# Altium footprint library PcbLib1.PcbLib: 45 footprints (part 2 of 3)
Each footprint in its own frame and in the unit in brackets; x right, y up, seen from the top. Pads: shape width x height; smd on the part's side, far side on the other; paste and mask are expansions set on the pad; w line width, h text height; cw(c..) or ccw(c..) is an arc to the next point about the centre after c.
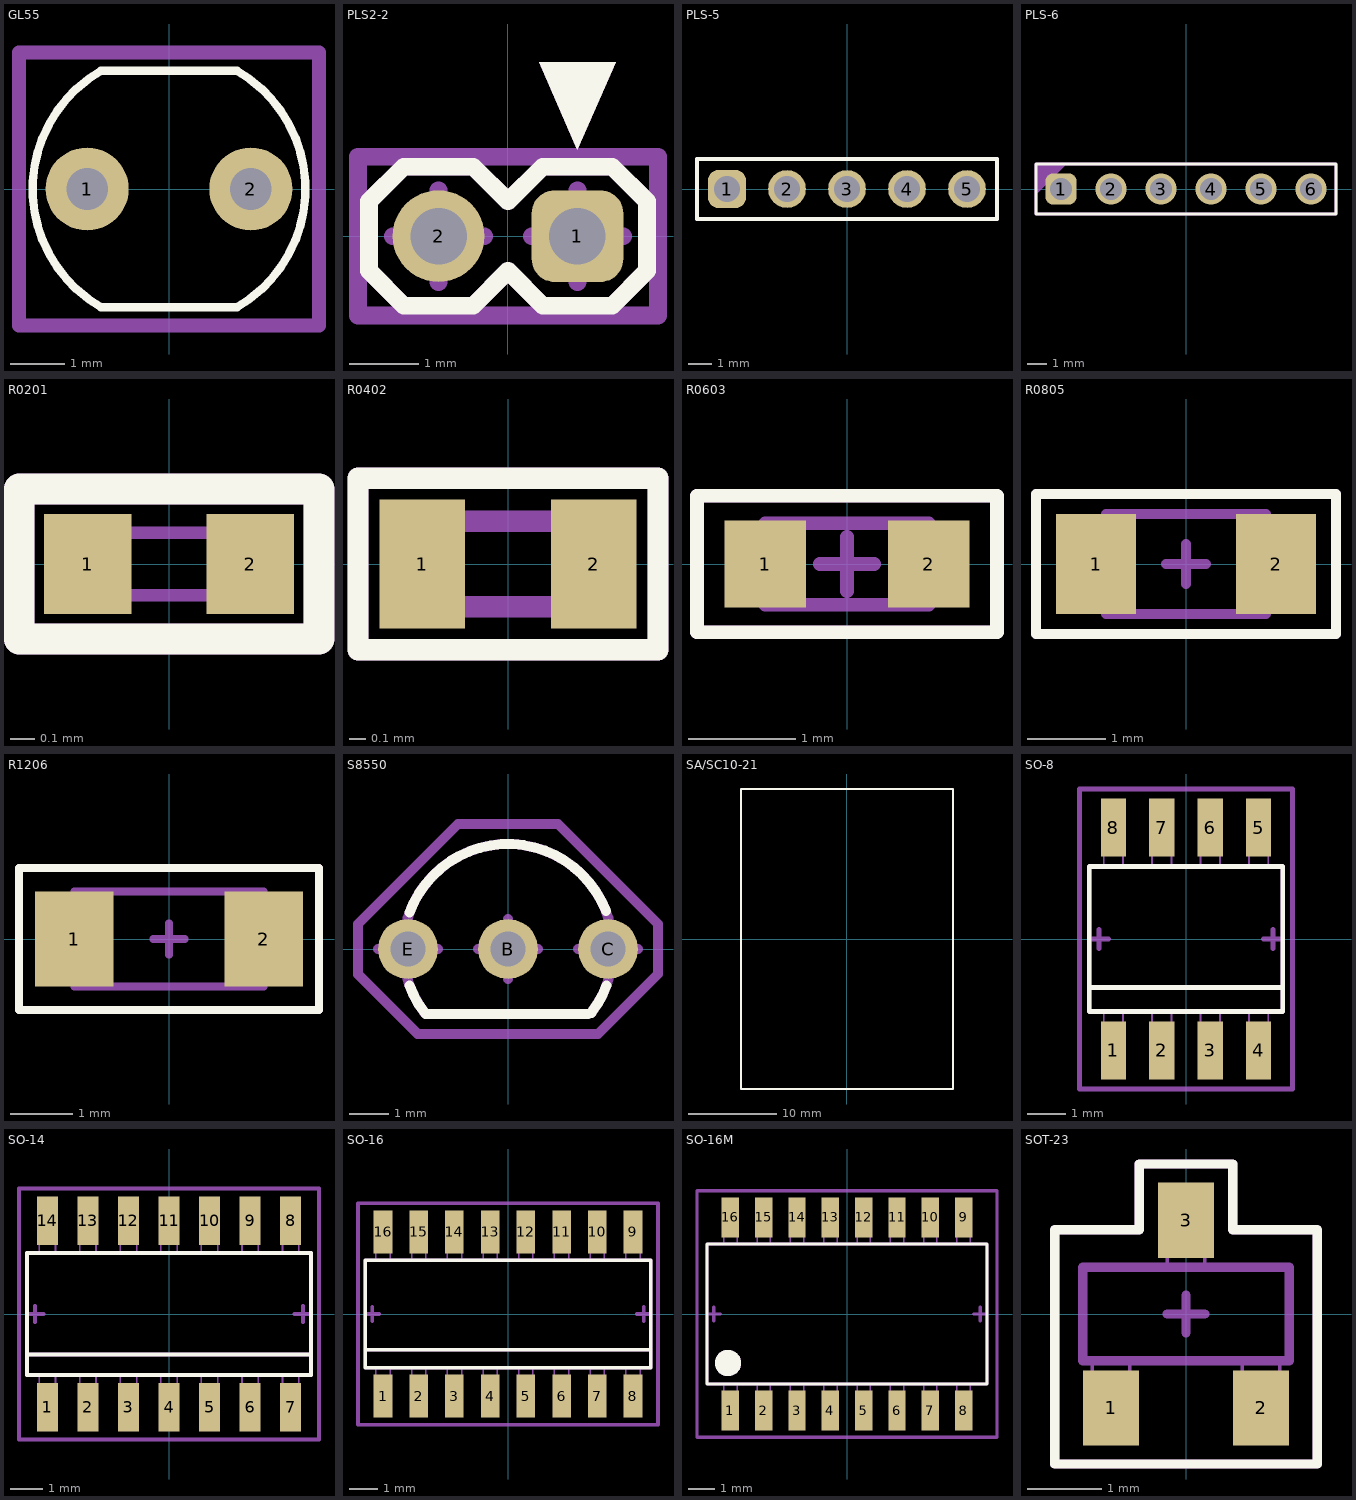
[diagram p1: the footprints below, top view; thin cyan lines are the x and y axes]

## GL55 [mil] "Series Photoresistor"
pads (2):
  round 60 hole 30: 1(-59.06,0) 2(59.06,0)
Top Overlay:
  lines w6: -49.21,-85.24 cw(c0,0) -49.21,85.24 49.21,85.24 cw(c0,0) 49.21,-85.24 -49.21,-85.24
Mechanical 15:
  lines w10: -108.27,-98.43 -108.27,98.43 108.27,98.43 108.27,-98.43 -108.27,-98.43

## PLS2-2 [mil]
pads (2):
  rrect50% 52x52 hole 32: 1(39.37,0)
  round 52 hole 32: 2(-39.37,0)
Top Overlay:
  region: 39.37,48.98 61,98.43 17.74,98.43
  lines w10: -78.74,-19.69 -59.06,-39.37 -19.68,-39.37 0,-19.68 19.68,-39.37 59.06,-39.37 78.74,-19.68 78.74,19.69 59.06,39.37 19.68,39.37 0,19.68 -19.68,39.37 -59.06,39.37 -78.74,19.69 -78.74,-19.69
Bottom 3D Body:
  region: 39.37,48.98 61,98.43 17.74,98.43
  lines w5: -49.21,-9.84 -29.53,9.84 ; -49.21,-9.84 -29.53,-9.84 ; -49.21,-9.84 -49.21,9.84 ; -49.21,9.84 -29.53,-9.84 ; -49.21,9.84 -29.53,9.84 ; -29.53,-9.84 -29.53,9.84 ; 29.53,-9.84 49.21,9.84 ; 29.53,-9.84 49.21,-9.84 ; 29.53,-9.84 29.53,9.84 ; 29.53,9.84 49.21,-9.84 ; 29.53,9.84 49.21,9.84 ; 49.21,-9.84 49.21,9.84
  lines w10: -78.74,-19.68 -59.06,-39.37 -19.68,-39.37 0,-19.68 19.68,-39.37 59.06,-39.37 78.74,-19.68 78.74,19.69 59.06,39.37 19.68,39.37 0,19.68 -19.68,39.37 -59.06,39.37 -78.74,19.69 -78.74,-19.69
  text "'.Designator'" at -137.8,54.06 h59.06
Mechanical 15:
  lines w10: -85,-45 -85,45 85,45 85,-45 -85,-45
Mechanical 25:
  lines w10: -65.37,0 -13.37,0 ; -39.37,-26 -39.37,26 ; 13.37,0 65.37,0 ; 39.37,-26 39.37,26
Mechanical 26:
  lines w10: -65.37,0 -13.37,0 ; -39.37,-26 -39.37,26 ; 13.37,0 65.37,0 ; 39.37,-26 39.37,26
3D body "DS1025-1õ1.STEP": height 236.22, standoff -110.24, extent 0.01,-39.38 78.75,39.36
3D body "DS1025-1õ1.STEP": height 236.22, standoff -110.24, extent -78.73,-39.37 0.01,39.37

## PLS-5 [mm]
pads (5):
  rrect50% 1.6x1.6 hole 1.1: 1(-5.08,0)
  round 1.6 hole 1.1: 2(-2.54,0) 3(0,0) 4(2.54,0) 5(5.08,0)
Top Overlay:
  lines w0.15: -6.35,-1.27 6.35,-1.27 6.35,1.27 -6.35,1.27 -6.35,-1.27
  text "." at -6,2 h0.1
Mechanical 29:
  lines w0.15: -6.35,-1.27 -6.35,1.27 6.35,1.27 6.35,-1.27 -6.35,-1.27
3D body "PLS-1.STEP": height 8.5, standoff -3, extent 3.81,-1.27 6.35,1.27
3D body "PLS-1.STEP": height 8.5, standoff -3, extent 1.27,-1.27 3.81,1.27
3D body "PLS-1.STEP": height 8.5, standoff -3, extent -1.27,-1.27 1.27,1.27
3D body "PLS-1.STEP": height 8.5, standoff -3, extent -3.81,-1.27 -1.27,1.27
3D body "PLS-1.STEP": height 8.5, standoff -3, extent -6.35,-1.27 -3.81,1.27

## PLS-6 [mm]
pads (6):
  rrect50% 1.6x1.6 hole 1.1: 1(-6.35,0)
  round 1.6 hole 1.1: 2(-3.81,0) 3(-1.27,0) 4(1.27,0) 5(3.81,0) 6(6.35,0)
Top Overlay:
  lines w0.15: -7.62,-1.27 -7.62,1.27 7.62,1.27 7.62,-1.27 -7.62,-1.27
Top Designator:
  text ".Designator" at -3.999,-0.267 h0.8
Mechanical 29:
  region: -7.62,1.27 -6.096,1.27 -7.62,-0.254
  lines w0.15: -7.62,-1.27 7.62,-1.27 7.62,1.27 -7.62,1.27 -7.62,-1.27
  text ".Designator" at -3.5,-0.3 h1
3D body "PLS-1.STEP": height 8.5, standoff -3, extent -7.62,-1.27 -5.08,1.27
3D body "PLS-1.STEP": height 8.5, standoff -3, extent -5.08,-1.27 -2.54,1.27
3D body "PLS-1.STEP": height 8.5, standoff -3, extent -2.54,-1.27 0,1.27
3D body "PLS-1.STEP": height 8.5, standoff -3, extent 0,-1.27 2.54,1.27
3D body "PLS-1.STEP": height 8.5, standoff -3, extent 2.54,-1.27 5.08,1.27
3D body "PLS-1.STEP": height 8.5, standoff -3, extent 5.08,-1.27 7.62,1.27

## R0201 [mil]
pads (2):
  rect 14x16 smd: 1(-13,0) 2(13,0)
Top Overlay:
  lines w5: -24,-12 24,-12 24,12 -24,12 -24,-12
Bottom 3D Body:
  lines w2: -10,-5 -10,5 10,5 10,-5 -10,-5
  text "'.Designator'" at -8,-2.5 h8
Mechanical 15:
  lines w5: -24,-12 -24,12 24,12 24,-12 -24,-12
3D body "CR-0201.STEP": height 9.69, standoff 0, extent -11.81,-5.91 11.81,5.9

## R0402 [mil]
pads (2):
  rect 20x30 smd: 1(-20,0) 2(20,0)
Top Overlay:
  lines w5: -35,-20 -35,20 35,20 35,-20 -35,-20
Bottom 3D Body:
  lines w5: -20,-10 -20,10 20,10 20,-10 -20,-10
  text "'.Designator'" at -14,-4 h15
Mechanical 15:
  lines w5: -35,-20 35,-20 35,20 -35,20 -35,-20
3D body "CR-0402.STEP": height 12.84, standoff 0, extent -19.69,-9.85 19.68,9.84

## R0603 [mil]
pads (2):
  rect 30x32 smd: 1(-30,0) 2(30,0)
Top Overlay:
  lines w5: -55,-25 -55,25 55,25 55,-25 -55,-25
Bottom 3D Body:
  lines w5: -30,-15 30,-15 30,15 -30,15 -30,-15
  text "'.Designator'" at -25,-10 h30
Mechanical 11:
  lines w5: -10,0 10,0 ; 0,-10 0,10
Mechanical 15:
  lines w5: -55,-25 55,-25 55,25 -55,25 -55,-25
3D body "CR-0603.STEP": height 17.95, standoff 0, extent -31.5,-15.75 31.5,15.74

## R0805 [mil]
pads (2):
  rect 40x50 smd: 1(-45,0) 2(45,0)
Top Overlay:
  lines w5: -75,-35 75,-35 75,35 -75,35 -75,-35
Bottom 3D Body:
  lines w5: -40,-25 -40,25 40,25 40,-25 -40,-25
  text "'.Designator'" at -33,-11 h40
Mechanical 11:
  lines w5: -10,0 10,0 ; 0,-10 0,10
Mechanical 15:
  lines w5: -75,-35 75,-35 75,35 -75,35 -75,-35
3D body "CR-0805.STEP": height 20.24, standoff 0, extent -40,-25 40,25

## R1206 [mil]
pads (2):
  rect 50x60 smd: 1(-60,0) 2(60,0)
Top Overlay:
  lines w5: -95,-45 95,-45 95,45 -95,45 -95,-45
Bottom 3D Body:
  lines w5: -60,-30 60,-30 60,30 -60,30 -60,-30
  text "'.Designator'" at -50,-10 h40
Mechanical 11:
  lines w5: -10,0 10,0 ; 0,-10 0,10
Mechanical 15:
  lines w5: -95,-45 95,-45 95,45 -95,45 -95,-45
3D body "CR-1206.STEP": height 20.24, standoff 0, extent -61,-31.5 61,31.49

## S8550 [mil]
pads (3):
  round 60 hole 35: B(0,0) C(100,0) E(-100,0)
Top Overlay:
  lines w10: -98.53,-36.3 ccw(c0,0) -82.56,-64.87 ; -98.53,36.3 cw(c0,0) 97.86,38.06 ; -80,-65 80,-65 ; 83.41,-63.78 ccw(c0,0) 98.53,-36.3
Bottom 3D Body:
  lines w10: -83.41,-63.78 cw(c0,0) 83.41,-63.78 ; -80,-65 80,-65
  text "'.Designator'" at -70,45 h60
Mechanical 15:
  lines w10: -150,-25.31 -90.31,-85 90,-85 150,-25 150,25 50,125 -50,125 -150,25 -150,-25.31
Mechanical 25:
  lines w10: -130,0 -70,0 ; -100,-30 -100,30 ; -30,0 30,0 ; 0,-30 0,30 ; 70,0 130,0 ; 100,-30 100,30
Mechanical 26:
  lines w10: -130,0 -70,0 ; -100,-30 -100,30 ; -30,0 30,0 ; 0,-30 0,30 ; 70,0 130,0 ; 100,-30 100,30
3D body "TO-92_Bent.STEP": height 389.76, standoff -98.43, extent -110.3,-69.3 110.03,85.43

## SA/SC10-21 [mil]
Top Overlay:
  lines w10: -472.44,-669.29 472.44,-669.29 472.44,669.29 -472.44,669.29 -472.44,-669.29

## SO-8 [mil]
pads (8):
  rect 26x60 smd: 1(-75,-115) 2(-25,-115) 3(25,-115) 4(75,-115) 5(75,115) 6(25,115) 7(-25,115) 8(-75,115)
Top Overlay:
  lines w5: -100,-50 100,-50 ; -100,-75 100,-75 100,75 -100,75 -100,-75
Bottom 3D Body:
  lines w2: -85,-105 -65,-105 ; -85,-95 -65,-95 ; -85,-75 -85,-130 -65,-130 -65,-75 ; -85,75 -85,130 -65,130 -65,75 ; -85,95 -65,95 ; -85,105 -65,105 ; -35,-105 -15,-105 ; -35,-95 -15,-95 ; -35,-75 -35,-130 -15,-130 -15,-75 ; -35,75 -35,130 -15,130 -15,75 ; -35,95 -15,95 ; -35,105 -15,105 ; 15,-105 35,-105 ; 15,-95 35,-95 ; 15,-75 15,-130 35,-130 35,-75 ; 15,75 15,130 35,130 35,75 ; 15,95 35,95 ; 15,105 35,105 ; 65,-105 85,-105 ; 65,-95 85,-95 ; 65,-75 65,-130 85,-130 85,-75 ; 65,75 65,130 85,130 85,75 ; 65,95 85,95 ; 65,105 85,105
  lines w5: -100,-50 100,-50 ; -100,-75 -100,75 100,75 100,-75 -100,-75
  text "'.Designator'" at -64.99,-15 h60
Mechanical 11:
  lines w5: -100,0 -80,0 ; -90,-10 -90,10 ; 80,0 100,0 ; 90,-10 90,10
Mechanical 15:
  lines w5: -110,-155 110,-155 110,155 -110,155 -110,-155
3D body "SO-8.STEP": height 72.83, standoff 0, extent -98.43,-125.98 98.42,125.99

## SO-14 [mil]
pads (14):
  rect 26x60 smd: 1(-150,-115) 2(-100,-115) 3(-50,-115) 4(0,-115) 5(50,-115) 6(100,-115) 7(150,-115) 8(150,115) 9(100,115) 10(50,115) 11(0,115) 12(-50,115) 13(-100,115) 14(-150,115)
Top Overlay:
  lines w5: -175,-50 175,-50 ; -175,-75 -175,75 175,75 175,-75 -175,-75
Bottom 3D Body:
  lines w2: -160,-105 -140,-105 ; -160,-95 -140,-95 ; -160,-75 -160,-130 -140,-130 -140,-75 ; -160,75 -160,130 -140,130 -140,75 ; -160,95 -140,95 ; -160,105 -140,105 ; -110,-105 -90,-105 ; -110,-95 -90,-95 ; -110,-75 -110,-130 -90,-130 -90,-75 ; -110,75 -110,130 -90,130 -90,75 ; -110,95 -90,95 ; -110,105 -90,105 ; -60,-105 -40,-105 ; -60,-95 -40,-95 ; -60,-75 -60,-130 -40,-130 -40,-75 ; -60,75 -60,130 -40,130 -40,75 ; -60,95 -40,95 ; -60,105 -40,105 ; -10,-105 10,-105 ; -10,-95 10,-95 ; -10,-75 -10,-130 10,-130 10,-75 ; -10,75 -10,130 10,130 10,75 ; -10,95 10,95 ; -10,105 10,105 ; 40,-105 60,-105 ; 40,-95 60,-95 ; 40,-75 40,-130 60,-130 60,-75 ; 40,75 40,130 60,130 60,75 ; 40,95 60,95 ; 40,105 60,105 ; 90,-105 110,-105 ; 90,-95 110,-95 ; 90,-75 90,-130 110,-130 110,-75 ; 90,75 90,130 110,130 110,75 ; 90,95 110,95 ; 90,105 110,105 ; 140,-105 160,-105 ; 140,-95 160,-95 ; 140,-75 140,-130 160,-130 160,-75 ; 140,75 140,130 160,130 160,75 ; 140,95 160,95 ; 140,105 160,105
  lines w5: -175,-50 175,-50 ; -175,-75 175,-75 175,75 -175,75 -175,-75
  text "'.Designator'" at -65,-15 h60
Mechanical 11:
  lines w5: -175,0 -155,0 ; -165,-10 -165,10 ; 155,0 175,0 ; 165,-10 165,10
Mechanical 15:
  lines w5: -185,-155 -185,155 185,155 185,-155 -185,-155
3D body "SO-14.STEP": height 72.83, standoff 0, extent -169.3,-125.98 169.29,125.99

## SO-16 [mil]
pads (16):
  rect 26x60 smd: 1(-175,-115) 2(-125,-115) 3(-75,-115) 4(-25,-115) 5(25,-115) 6(75,-115) 7(125,-115) 8(175,-115) 9(175,115) 10(125,115) 11(75,115) 12(25,115) 13(-25,115) 14(-75,115) 15(-125,115) 16(-175,115)
Top Overlay:
  lines w5: -200,-50 200,-50 ; -200,-75 200,-75 200,75 -200,75 -200,-75
Bottom 3D Body:
  lines w2: -185,-105 -165,-105 ; -185,-95 -165,-95 ; -185,-75 -185,-130 -165,-130 -165,-75 ; -185,75 -185,130 -165,130 -165,75 ; -185,95 -165,95 ; -185,105 -165,105 ; -135,-105 -115,-105 ; -135,-95 -115,-95 ; -135,-75 -135,-130 -115,-130 -115,-75 ; -135,75 -135,130 -115,130 -115,75 ; -135,95 -115,95 ; -135,105 -115,105 ; -85,-105 -65,-105 ; -85,-95 -65,-95 ; -85,-75 -85,-130 -65,-130 -65,-75 ; -85,75 -85,130 -65,130 -65,75 ; -85,95 -65,95 ; -85,105 -65,105 ; -35,-105 -15,-105 ; -35,-95 -15,-95 ; -35,-75 -35,-130 -15,-130 -15,-75 ; -35,75 -35,130 -15,130 -15,75 ; -35,95 -15,95 ; -35,105 -15,105 ; 15,-105 35,-105 ; 15,-95 35,-95 ; 15,-75 15,-130 35,-130 35,-75 ; 15,75 15,130 35,130 35,75 ; 15,95 35,95 ; 15,105 35,105 ; 65,-105 85,-105 ; 65,-95 85,-95 ; 65,-75 65,-130 85,-130 85,-75 ; 65,75 65,130 85,130 85,75 ; 65,95 85,95 ; 65,105 85,105 ; 115,-105 135,-105 ; 115,-95 135,-95 ; 115,-75 115,-130 135,-130 135,-75 ; 115,75 115,130 135,130 135,75 ; 115,95 135,95 ; 115,105 135,105 ; 165,-105 185,-105 ; 165,-95 185,-95 ; 165,-75 165,-130 185,-130 185,-75 ; 165,75 165,130 185,130 185,75 ; 165,95 185,95 ; 165,105 185,105
  lines w5: -200,-50 200,-50 ; -200,-75 -200,75 200,75 200,-75 -200,-75
  text "'.Designator'" at -64.99,-15 h60
Mechanical 11:
  lines w5: -200,0 -180,0 ; -190,-10 -190,10 ; 180,0 200,0 ; 190,-10 190,10
Mechanical 15:
  lines w5: -210,-155 210,-155 210,155 -210,155 -210,-155
3D body "SO-16.STEP": height 72.83, standoff 0, extent -196.85,-125.98 196.85,125.99

## SO-16M [mil]
pads (16):
  rect 26x60 smd: 1(-175,-145) 2(-125,-145) 3(-75,-145) 4(-25,-145) 5(25,-145) 6(75,-145) 7(125,-145) 8(175,-145) 9(175,145) 10(125,145) 11(75,145) 12(25,145) 13(-25,145) 14(-75,145) 15(-125,145) 16(-175,145)
Top Overlay:
  circle w19.68: c-178.5,-73.52 r9.84
  lines w5: -210,-105 -210,105 210,105 210,-105 -210,-105
Bottom 3D Body:
  circle w19.68: c-178.5,-73.52 r9.84
  lines w2: -185,-135 -165,-135 ; -185,-125 -165,-125 ; -185,-105 -185,-160 -165,-160 -165,-105 ; -185,105 -185,160 -165,160 -165,105 ; -185,125 -165,125 ; -185,135 -165,135 ; -135,-135 -115,-135 ; -135,-125 -115,-125 ; -135,-105 -135,-160 -115,-160 -115,-105 ; -135,105 -135,160 -115,160 -115,105 ; -135,125 -115,125 ; -135,135 -115,135 ; -85,-135 -65,-135 ; -85,-125 -65,-125 ; -85,-105 -85,-160 -65,-160 -65,-105 ; -85,105 -85,160 -65,160 -65,105 ; -85,125 -65,125 ; -85,135 -65,135 ; -35,-135 -15,-135 ; -35,-125 -15,-125 ; -35,-105 -35,-160 -15,-160 -15,-105 ; -35,105 -35,160 -15,160 -15,105 ; -35,125 -15,125 ; -35,135 -15,135 ; 15,-135 35,-135 ; 15,-125 35,-125 ; 15,-105 15,-160 35,-160 35,-105 ; 15,105 15,160 35,160 35,105 ; 15,125 35,125 ; 15,135 35,135 ; 65,-135 85,-135 ; 65,-125 85,-125 ; 65,-105 65,-160 85,-160 85,-105 ; 65,105 65,160 85,160 85,105 ; 65,125 85,125 ; 65,135 85,135 ; 115,-135 135,-135 ; 115,-125 135,-125 ; 115,-105 115,-160 135,-160 135,-105 ; 115,105 115,160 135,160 135,105 ; 115,125 135,125 ; 115,135 135,135 ; 165,-135 185,-135 ; 165,-125 185,-125 ; 165,-105 165,-160 185,-160 185,-105 ; 165,105 165,160 185,160 185,105 ; 165,125 185,125 ; 165,135 185,135
  lines w5: -210,-105 210,-105 210,105 -210,105 -210,-105
  text "'.Designator'" at -64.99,-15 h60
Mechanical 11:
  lines w5: -210,0 -190,0 ; -200,-10 -200,10 ; 190,0 210,0 ; 200,-10 200,10
Mechanical 15:
  lines w5: -225,-185 -225,185 225,185 225,-185 -225,-185
3D body "SO-16M.STEP": height 78.74, standoff 1.57, extent -206.7,-161.41 206.69,161.42

## SOT-23 [mil]
pads (3):
  rect 30x40 smd: 1(-40,-50) 2(40,-50) 3(0,50)
Top Overlay:
  lines w5: -70,-80 -70,45 -25,45 -25,80 25,80 25,45 70,45 70,-80 -70,-80
Bottom 3D Body:
  lines w2: -50,-40 -30,-40 ; -50,-35 -30,-35 ; -50,-25 -50,-50 -30,-50 -30,-25 ; -10,25 -10,50 10,50 10,25 ; -10,35 10,35 ; -10,40 10,40 ; 30,-40 50,-40 ; 30,-35 50,-35 ; 30,-25 30,-50 50,-50 50,-25
  lines w5: -55,-25 55,-25 55,25 -55,25 -55,-25
  text "'.Designator'" at -30,-10 h40
Mechanical 11:
  lines w5: -10,0 10,0 ; 0,-10 0,10
Mechanical 15:
  lines w5: -70,-80 -70,45 -25,45 -25,80 25,80 25,45 70,45 70,-80 -70,-80
3D body "SOT-23.STEP": height 43.31, standoff -0.1, extent -59.05,-51.17 59.06,51.19